# Altium footprint library ref-packages-longpad.PCBLIB: 1527 footprints (part 79 of 103) (continued)
## SQFP-S-28X28-128 [mm] (continued)
  rectangle: -15.9,7.38 -14.45,7.82
  rectangle: -15.9,6.58 -14.45,7.02
  rectangle: -15.9,5.78 -14.45,6.22
  rectangle: -15.9,4.98 -14.45,5.42
  rectangle: -15.9,4.18 -14.45,4.62
  rectangle: -15.9,3.38 -14.45,3.82
  rectangle: -15.9,2.58 -14.45,3.02
  rectangle: -15.9,1.78 -14.45,2.22
  rectangle: -15.9,0.98 -14.45,1.42
  rectangle: -15.9,0.18 -14.45,0.62
  rectangle: -15.9,-0.62 -14.45,-0.18
  rectangle: -15.9,-1.42 -14.45,-0.98
  rectangle: -15.9,-2.22 -14.45,-1.78
  rectangle: -15.9,-3.02 -14.45,-2.58
  rectangle: -15.9,-3.82 -14.45,-3.38
  rectangle: -15.9,-4.62 -14.45,-4.18
  rectangle: -15.9,-5.42 -14.45,-4.98
  rectangle: -15.9,-6.22 -14.45,-5.78
  rectangle: -15.9,-7.02 -14.45,-6.58
  rectangle: -15.9,-7.82 -14.45,-7.38
  rectangle: -15.9,-8.62 -14.45,-8.18
  rectangle: -15.9,-9.42 -14.45,-8.98
  rectangle: -15.9,-10.22 -14.45,-9.78
  rectangle: -15.9,-11.02 -14.45,-10.58
  rectangle: -15.9,-11.82 -14.45,-11.38
  rectangle: -15.9,-12.62 -14.45,-12.18
  lines w0.203: -14.36,-14.36 14.36,-14.36 14.36,14.36 -14.36,14.36 -14.36,-14.36
Mechanical 27:
  lines w0.2: -16.4,-16.4 -16.4,16.4 16.4,16.4 16.4,-16.4 -16.4,-16.4

## SQFP-S-28X28-144 [mm]
pads (144):
  rect 0.4x1.8 smd: 1(-11.375,-15) 2(-10.725,-15) 3(-10.075,-15) 4(-9.425,-15) 5(-8.775,-15) 6(-8.125,-15) 7(-7.475,-15) 8(-6.825,-15) 9(-6.175,-15) 10(-5.525,-15) 11(-4.875,-15) 12(-4.225,-15) 13(-3.575,-15) 14(-2.925,-15) 15(-2.275,-15) 16(-1.625,-15) 17(-0.975,-15) 18(-0.325,-15) 19(0.325,-15) 20(0.975,-15) 21(1.625,-15) 22(2.275,-15) 23(2.925,-15) 24(3.575,-15) 25(4.225,-15) 26(4.875,-15) 27(5.525,-15) 28(6.175,-15) 29(6.825,-15) 30(7.475,-15) 31(8.125,-15) 32(8.775,-15) 33(9.425,-15) 34(10.075,-15) 35(10.725,-15) 36(11.375,-15) 73(11.375,15) 74(10.725,15) 75(10.075,15) 76(9.425,15) 77(8.775,15) 78(8.125,15) 79(7.475,15) 80(6.825,15) 81(6.175,15) 82(5.525,15) 83(4.875,15) 84(4.225,15) 85(3.575,15) 86(2.925,15) 87(2.275,15) 88(1.625,15) 89(0.975,15) 90(0.325,15) 91(-0.325,15) 92(-0.975,15) 93(-1.625,15) 94(-2.275,15) 95(-2.925,15) 96(-3.575,15) 97(-4.225,15) 98(-4.875,15) 99(-5.525,15) 100(-6.175,15) 101(-6.825,15) 102(-7.475,15) 103(-8.125,15) 104(-8.775,15) 105(-9.425,15) 106(-10.075,15) 107(-10.725,15) 108(-11.375,15)
  rect 1.8x0.4 smd: 37(15,-11.375) 38(15,-10.725) 39(15,-10.075) 40(15,-9.425) 41(15,-8.775) 42(15,-8.125) 43(15,-7.475) 44(15,-6.825) 45(15,-6.175) 46(15,-5.525) 47(15,-4.875) 48(15,-4.225) 49(15,-3.575) 50(15,-2.925) 51(15,-2.275) 52(15,-1.625) 53(15,-0.975) 54(15,-0.325) 55(15,0.325) 56(15,0.975) 57(15,1.625) 58(15,2.275) 59(15,2.925) 60(15,3.575) 61(15,4.225) 62(15,4.875) 63(15,5.525) 64(15,6.175) 65(15,6.825) 66(15,7.475) 67(15,8.125) 68(15,8.775) 69(15,9.425) 70(15,10.075) 71(15,10.725) 72(15,11.375) 109(-15,11.375) 110(-15,10.725) 111(-15,10.075) 112(-15,9.425) 113(-15,8.775) 114(-15,8.125) 115(-15,7.475) 116(-15,6.825) 117(-15,6.175) 118(-15,5.525) 119(-15,4.875) 120(-15,4.225) 121(-15,3.575) 122(-15,2.925) 123(-15,2.275) 124(-15,1.625) 125(-15,0.975) 126(-15,0.325) 127(-15,-0.325) 128(-15,-0.975) 129(-15,-1.625) 130(-15,-2.275) 131(-15,-2.925) 132(-15,-3.575) 133(-15,-4.225) 134(-15,-4.875) 135(-15,-5.525) 136(-15,-6.175) 137(-15,-6.825) 138(-15,-7.475) 139(-15,-8.125) 140(-15,-8.775) 141(-15,-9.425) 142(-15,-10.075) 143(-15,-10.725) 144(-15,-11.375)
Top Overlay:
  circle w0.254: c-11.5,-12.75 r0.75
  lines w0.203: -14.17,-14.16 14.16,-14.16 14.16,14.16 -14.17,14.16 -14.17,-14.16
Mechanical 16:
  rectangle: -11.565,-15.9 -11.195,-14.45
  rectangle: -10.915,-15.9 -10.545,-14.45
  rectangle: -10.265,-15.9 -9.895,-14.45
  rectangle: -9.615,-15.9 -9.245,-14.45
  rectangle: -8.965,-15.9 -8.595,-14.45
  rectangle: -8.315,-15.9 -7.945,-14.45
  rectangle: -7.665,-15.9 -7.295,-14.45
  rectangle: -7.015,-15.9 -6.645,-14.45
  rectangle: -6.365,-15.9 -5.995,-14.45
  rectangle: -5.715,-15.9 -5.345,-14.45
  rectangle: -5.065,-15.9 -4.695,-14.45
  rectangle: -4.415,-15.9 -4.045,-14.45
  rectangle: -3.765,-15.9 -3.395,-14.45
  rectangle: -3.115,-15.9 -2.745,-14.45
  rectangle: -2.465,-15.9 -2.095,-14.45
  rectangle: -1.815,-15.9 -1.445,-14.45
  rectangle: -1.165,-15.9 -0.795,-14.45
  rectangle: -0.515,-15.9 -0.145,-14.45
  rectangle: 0.135,-15.9 0.505,-14.45
  rectangle: 0.785,-15.9 1.155,-14.45
  rectangle: 1.435,-15.9 1.805,-14.45
  rectangle: 2.085,-15.9 2.455,-14.45
  rectangle: 2.735,-15.9 3.105,-14.45
  rectangle: 3.385,-15.9 3.755,-14.45
  rectangle: 4.035,-15.9 4.405,-14.45
  rectangle: 4.685,-15.9 5.055,-14.45
  rectangle: 5.335,-15.9 5.705,-14.45
  rectangle: 5.985,-15.9 6.355,-14.45
  rectangle: 6.635,-15.9 7.005,-14.45
  rectangle: 7.285,-15.9 7.655,-14.45
  rectangle: 7.935,-15.9 8.305,-14.45
  rectangle: 8.585,-15.9 8.955,-14.45
  rectangle: 9.235,-15.9 9.605,-14.45
  rectangle: 9.885,-15.9 10.255,-14.45
  rectangle: 10.535,-15.9 10.905,-14.45
  rectangle: 11.185,-15.9 11.555,-14.45
  rectangle: 14.45,-11.565 15.9,-11.195
  rectangle: 14.45,-10.915 15.9,-10.545
  rectangle: 14.45,-10.265 15.9,-9.895
  rectangle: 14.45,-9.615 15.9,-9.245
  rectangle: 14.45,-8.965 15.9,-8.595
  rectangle: 14.45,-8.315 15.9,-7.945
  rectangle: 14.45,-7.665 15.9,-7.295
  rectangle: 14.45,-7.015 15.9,-6.645
  rectangle: 14.45,-6.365 15.9,-5.995
  rectangle: 14.45,-5.715 15.9,-5.345
  rectangle: 14.45,-5.065 15.9,-4.695
  rectangle: 14.45,-4.415 15.9,-4.045
  rectangle: 14.45,-3.765 15.9,-3.395
  rectangle: 14.45,-3.115 15.9,-2.745
  rectangle: 14.45,-2.465 15.9,-2.095
  rectangle: 14.45,-1.815 15.9,-1.445
  rectangle: 14.45,-1.165 15.9,-0.795
  rectangle: 14.45,-0.515 15.9,-0.145
  rectangle: 14.45,0.135 15.9,0.505
  rectangle: 14.45,0.785 15.9,1.155
  rectangle: 14.45,1.435 15.9,1.805
  rectangle: 14.45,2.085 15.9,2.455
  rectangle: 14.45,2.735 15.9,3.105
  rectangle: 14.45,3.385 15.9,3.755
  rectangle: 14.45,4.035 15.9,4.405
  rectangle: 14.45,4.685 15.9,5.055
  rectangle: 14.45,5.335 15.9,5.705
  rectangle: 14.45,5.985 15.9,6.355
  rectangle: 14.45,6.635 15.9,7.005
  rectangle: 14.45,7.285 15.9,7.655
  rectangle: 14.45,7.935 15.9,8.305
  rectangle: 14.45,8.585 15.9,8.955
  rectangle: 14.45,9.235 15.9,9.605
  rectangle: 14.45,9.885 15.9,10.255
  rectangle: 14.45,10.535 15.9,10.905
  rectangle: 14.45,11.185 15.9,11.555
  rectangle: 11.195,14.45 11.565,15.9
  rectangle: 10.545,14.45 10.915,15.9
  rectangle: 9.895,14.45 10.265,15.9
  rectangle: 9.245,14.45 9.615,15.9
  rectangle: 8.595,14.45 8.965,15.9
  rectangle: 7.945,14.45 8.315,15.9
  rectangle: 7.295,14.45 7.665,15.9
  rectangle: 6.645,14.45 7.015,15.9
  rectangle: 5.995,14.45 6.365,15.9
  rectangle: 5.345,14.45 5.715,15.9
  rectangle: 4.695,14.45 5.065,15.9
  rectangle: 4.045,14.45 4.415,15.9
  rectangle: 3.395,14.45 3.765,15.9
  rectangle: 2.745,14.45 3.115,15.9
  rectangle: 2.095,14.45 2.465,15.9
  rectangle: 1.445,14.45 1.815,15.9
  rectangle: 0.795,14.45 1.165,15.9
  rectangle: 0.145,14.45 0.515,15.9
  rectangle: -0.505,14.45 -0.135,15.9
  rectangle: -1.155,14.45 -0.785,15.9
  rectangle: -1.805,14.45 -1.435,15.9
  rectangle: -2.455,14.45 -2.085,15.9
  rectangle: -3.105,14.45 -2.735,15.9
  rectangle: -3.755,14.45 -3.385,15.9
  rectangle: -4.405,14.45 -4.035,15.9
  rectangle: -5.055,14.45 -4.685,15.9
  rectangle: -5.705,14.45 -5.335,15.9
  rectangle: -6.355,14.45 -5.985,15.9
  rectangle: -7.005,14.45 -6.635,15.9
  rectangle: -7.655,14.45 -7.285,15.9
  rectangle: -8.305,14.45 -7.935,15.9
  rectangle: -8.955,14.45 -8.585,15.9
  rectangle: -9.605,14.45 -9.235,15.9
  rectangle: -10.255,14.45 -9.885,15.9
  rectangle: -10.905,14.45 -10.535,15.9
  rectangle: -11.555,14.45 -11.185,15.9
  rectangle: -15.9,11.195 -14.45,11.565
  rectangle: -15.9,10.545 -14.45,10.915
  rectangle: -15.9,9.895 -14.45,10.265
  rectangle: -15.9,9.245 -14.45,9.615
  rectangle: -15.9,8.595 -14.45,8.965
  rectangle: -15.9,7.945 -14.45,8.315
  rectangle: -15.9,7.295 -14.45,7.665
  rectangle: -15.9,6.645 -14.45,7.015
  rectangle: -15.9,5.995 -14.45,6.365
  rectangle: -15.9,5.345 -14.45,5.715
  rectangle: -15.9,4.695 -14.45,5.065
  rectangle: -15.9,4.045 -14.45,4.415
  rectangle: -15.9,3.395 -14.45,3.765
  rectangle: -15.9,2.745 -14.45,3.115
  rectangle: -15.9,2.095 -14.45,2.465
  rectangle: -15.9,1.445 -14.45,1.815
  rectangle: -15.9,0.795 -14.45,1.165
  rectangle: -15.9,0.145 -14.45,0.515
  rectangle: -15.9,-0.505 -14.45,-0.135
  rectangle: -15.9,-1.155 -14.45,-0.785
  rectangle: -15.9,-1.805 -14.45,-1.435
  rectangle: -15.9,-2.455 -14.45,-2.085
  rectangle: -15.9,-3.105 -14.45,-2.735
  rectangle: -15.9,-3.755 -14.45,-3.385
  rectangle: -15.9,-4.405 -14.45,-4.035
  rectangle: -15.9,-5.055 -14.45,-4.685
  rectangle: -15.9,-5.705 -14.45,-5.335
  rectangle: -15.9,-6.355 -14.45,-5.985
  rectangle: -15.9,-7.005 -14.45,-6.635
  rectangle: -15.9,-7.655 -14.45,-7.285
  rectangle: -15.9,-8.305 -14.45,-7.935
  rectangle: -15.9,-8.955 -14.45,-8.585
  rectangle: -15.9,-9.605 -14.45,-9.235
  rectangle: -15.9,-10.255 -14.45,-9.885
  rectangle: -15.9,-10.905 -14.45,-10.535
  rectangle: -15.9,-11.555 -14.45,-11.185
  lines w0.203: -14.36,-14.36 14.36,-14.36 14.36,14.36 -14.36,14.36 -14.36,-14.36
Mechanical 27:
  lines w0.2: -16.4,-16.4 -16.4,16.4 16.4,16.4 16.4,-16.4 -16.4,-16.4

## SQFP-S-28X28-160 [mm]
pads (160):
  rect 0.4x1.8 smd: 1(-12.675,-15) 2(-12.025,-15) 3(-11.375,-15) 4(-10.725,-15) 5(-10.075,-15) 6(-9.425,-15) 7(-8.775,-15) 8(-8.125,-15) 9(-7.475,-15) 10(-6.825,-15) 11(-6.175,-15) 12(-5.525,-15) 13(-4.875,-15) 14(-4.225,-15) 15(-3.575,-15) 16(-2.925,-15) 17(-2.275,-15) 18(-1.625,-15) 19(-0.975,-15) 20(-0.325,-15) 21(0.325,-15) 22(0.975,-15) 23(1.625,-15) 24(2.275,-15) 25(2.925,-15) 26(3.575,-15) 27(4.225,-15) 28(4.875,-15) 29(5.525,-15) 30(6.175,-15) 31(6.825,-15) 32(7.475,-15) 33(8.125,-15) 34(8.775,-15) 35(9.425,-15) 36(10.075,-15) 37(10.725,-15) 38(11.375,-15) 39(12.025,-15) 40(12.675,-15) 81(12.675,15) 82(12.025,15) 83(11.375,15) 84(10.725,15) 85(10.075,15) 86(9.425,15) 87(8.775,15) 88(8.125,15) 89(7.475,15) 90(6.825,15) 91(6.175,15) 92(5.525,15) 93(4.875,15) 94(4.225,15) 95(3.575,15) 96(2.925,15) 97(2.275,15) 98(1.625,15) 99(0.975,15) 100(0.325,15) 101(-0.325,15) 102(-0.975,15) 103(-1.625,15) 104(-2.275,15) 105(-2.925,15) 106(-3.575,15) 107(-4.225,15) 108(-4.875,15) 109(-5.525,15) 110(-6.175,15) 111(-6.825,15) 112(-7.475,15) 113(-8.125,15) 114(-8.775,15) 115(-9.425,15) 116(-10.075,15) 117(-10.725,15) 118(-11.375,15) 119(-12.025,15) 120(-12.675,15)
  rect 1.8x0.4 smd: 41(15,-12.675) 42(15,-12.025) 43(15,-11.375) 44(15,-10.725) 45(15,-10.075) 46(15,-9.425) 47(15,-8.775) 48(15,-8.125) 49(15,-7.475) 50(15,-6.825) 51(15,-6.175) 52(15,-5.525) 53(15,-4.875) 54(15,-4.225) 55(15,-3.575) 56(15,-2.925) 57(15,-2.275) 58(15,-1.625) 59(15,-0.975) 60(15,-0.325) 61(15,0.325) 62(15,0.975) 63(15,1.625) 64(15,2.275) 65(15,2.925) 66(15,3.575) 67(15,4.225) 68(15,4.875) 69(15,5.525) 70(15,6.175) 71(15,6.825) 72(15,7.475) 73(15,8.125) 74(15,8.775) 75(15,9.425) 76(15,10.075) 77(15,10.725) 78(15,11.375) 79(15,12.025) 80(15,12.675) 121(-15,12.675) 122(-15,12.025) 123(-15,11.375) 124(-15,10.725) 125(-15,10.075) 126(-15,9.425) 127(-15,8.775) 128(-15,8.125) 129(-15,7.475) 130(-15,6.825) 131(-15,6.175) 132(-15,5.525) 133(-15,4.875) 134(-15,4.225) 135(-15,3.575) 136(-15,2.925) 137(-15,2.275) 138(-15,1.625) 139(-15,0.975) 140(-15,0.325) 141(-15,-0.325) 142(-15,-0.975) 143(-15,-1.625) 144(-15,-2.275) 145(-15,-2.925) 146(-15,-3.575) 147(-15,-4.225) 148(-15,-4.875) 149(-15,-5.525) 150(-15,-6.175) 151(-15,-6.825) 152(-15,-7.475) 153(-15,-8.125) 154(-15,-8.775) 155(-15,-9.425) 156(-15,-10.075) 157(-15,-10.725) 158(-15,-11.375) 159(-15,-12.025) 160(-15,-12.675)
Top Overlay:
  circle w0.254: c-12.75,-12.75 r0.75
  lines w0.203: -14.17,-14.16 14.16,-14.16 14.16,14.16 -14.17,14.16 -14.17,-14.16
Mechanical 16:
  drawing of 164 lines, arcs and shapes, not listed
Mechanical 27:
  lines w0.2: -16.4,-16.4 -16.4,16.4 16.4,16.4 16.4,-16.4 -16.4,-16.4

## SQFP-S-28X28-208 [mil]
pads (208):
  rect 11.81x62.99 smd: 1(-501.97,-574.8) 2(-482.28,-574.8) 3(-462.6,-574.8) 4(-442.91,-574.8) 5(-423.23,-574.8) 6(-403.54,-574.8) 7(-383.86,-574.8) 8(-364.17,-574.8) 9(-344.49,-574.8) 10(-324.8,-574.8) 11(-305.12,-574.8) 12(-285.43,-574.8) 13(-265.75,-574.8) 14(-246.06,-574.8) 15(-226.38,-574.8) 16(-206.69,-574.8) 17(-187.01,-574.8) 18(-167.32,-574.8) 19(-147.64,-574.8) 20(-127.95,-574.8) 21(-108.27,-574.8) 22(-88.58,-574.8) 23(-68.9,-574.8) 24(-49.21,-574.8) 25(-29.53,-574.8) 26(-9.84,-574.8) 27(9.84,-574.8) 28(29.53,-574.8) 29(49.21,-574.8) 30(68.9,-574.8) 31(88.58,-574.8) 32(108.27,-574.8) 33(127.95,-574.8) 34(147.64,-574.8) 35(167.32,-574.8) 36(187.01,-574.8) 37(206.69,-574.8) 38(226.38,-574.8) 39(246.06,-574.8) 40(265.75,-574.8) 41(285.43,-574.8) 42(305.12,-574.8) 43(324.8,-574.8) 44(344.49,-574.8) 45(364.17,-574.8) 46(383.86,-574.8) 47(403.54,-574.8) 48(423.23,-574.8) 49(442.91,-574.8) 50(462.6,-574.8) 51(482.28,-574.8) 52(501.97,-574.8) 105(501.97,574.8) 106(482.28,574.8) 107(462.6,574.8) 108(442.91,574.8) 109(423.23,574.8) 110(403.54,574.8) 111(383.86,574.8) 112(364.17,574.8) 113(344.49,574.8) 114(324.8,574.8) 115(305.12,574.8) 116(285.43,574.8) 117(265.75,574.8) 118(246.06,574.8) 119(226.38,574.8) 120(206.69,574.8) 121(187.01,574.8) 122(167.32,574.8) 123(147.64,574.8) 124(127.95,574.8) 125(108.27,574.8) 126(88.58,574.8) 127(68.9,574.8) 128(49.21,574.8) 129(29.53,574.8) 130(9.84,574.8) 131(-9.84,574.8) 132(-29.53,574.8) 133(-49.21,574.8) 134(-68.9,574.8) 135(-88.58,574.8) 136(-108.27,574.8) 137(-127.95,574.8) 138(-147.64,574.8) 139(-167.32,574.8) 140(-187.01,574.8) 141(-206.69,574.8) 142(-226.38,574.8) 143(-246.06,574.8) 144(-265.75,574.8) 145(-285.43,574.8) 146(-305.12,574.8) 147(-324.8,574.8) 148(-344.49,574.8) 149(-364.17,574.8) 150(-383.86,574.8) 151(-403.54,574.8) 152(-423.23,574.8) 153(-442.91,574.8) 154(-462.6,574.8) 155(-482.28,574.8) 156(-501.97,574.8)
  rect 62.99x11.81 smd: 53(574.8,-501.97) 54(574.8,-482.28) 55(574.8,-462.6) 56(574.8,-442.91) 57(574.8,-423.23) 58(574.8,-403.54) 59(574.8,-383.86) 60(574.8,-364.17) 61(574.8,-344.49) 62(574.8,-324.8) 63(574.8,-305.12) 64(574.8,-285.43) 65(574.8,-265.75) 66(574.8,-246.06) 67(574.8,-226.38) 68(574.8,-206.69) 69(574.8,-187.01) 70(574.8,-167.32) 71(574.8,-147.64) 72(574.8,-127.95) 73(574.8,-108.27) 74(574.8,-88.58) 75(574.8,-68.9) 76(574.8,-49.21) 77(574.8,-29.53) 78(574.8,-9.84) 79(574.8,9.84) 80(574.8,29.53) 81(574.8,49.21) 82(574.8,68.9) 83(574.8,88.58) 84(574.8,108.27) 85(574.8,127.95) 86(574.8,147.64) 87(574.8,167.32) 88(574.8,187.01) 89(574.8,206.69) 90(574.8,226.38) 91(574.8,246.06) 92(574.8,265.75) 93(574.8,285.43) 94(574.8,305.12) 95(574.8,324.8) 96(574.8,344.49) 97(574.8,364.17) 98(574.8,383.86) 99(574.8,403.54) 100(574.8,423.23) 101(574.8,442.91) 102(574.8,462.6) 103(574.8,482.28) 104(574.8,501.97) 157(-574.8,501.97) 158(-574.8,482.28) 159(-574.8,462.6) 160(-574.8,442.91) 161(-574.8,423.23) 162(-574.8,403.54) 163(-574.8,383.86) 164(-574.8,364.17) 165(-574.8,344.49) 166(-574.8,324.8) 167(-574.8,305.12) 168(-574.8,285.43) 169(-574.8,265.75) 170(-574.8,246.06) 171(-574.8,226.38) 172(-574.8,206.69) 173(-574.8,187.01) 174(-574.8,167.32) 175(-574.8,147.64) 176(-574.8,127.95) 177(-574.8,108.27) 178(-574.8,88.58) 179(-574.8,68.9) 180(-574.8,49.21) 181(-574.8,29.53) 182(-574.8,9.84) 183(-574.8,-9.84) 184(-574.8,-29.53) 185(-574.8,-49.21) 186(-574.8,-68.9) 187(-574.8,-88.58) 188(-574.8,-108.27) 189(-574.8,-127.95) 190(-574.8,-147.64) 191(-574.8,-167.32) 192(-574.8,-187.01) 193(-574.8,-206.69) 194(-574.8,-226.38) 195(-574.8,-246.06) 196(-574.8,-265.75) 197(-574.8,-285.43) 198(-574.8,-305.12) 199(-574.8,-324.8) 200(-574.8,-344.49) 201(-574.8,-364.17) 202(-574.8,-383.86) 203(-574.8,-403.54) 204(-574.8,-423.23) 205(-574.8,-442.91) 206(-574.8,-462.6) 207(-574.8,-482.28) 208(-574.8,-501.97)
Top Overlay:
  circle w10: c-472.44,-472.44 r29.53
  lines w8: -538.19,-537.8 537.8,-537.8 537.8,537.8 -538.19,537.8 -538.19,-537.8
Mechanical 16:
  drawing of 213 lines, arcs and shapes, not listed
Mechanical 27:
  lines w7.87: -625.98,-625.98 -625.98,625.98 625.98,625.98 625.98,-625.98 -625.98,-625.98

## SQFP-S-28X28-216 [mil]
pads (216):
  rect 11.81x62.99 smd: 1(-521.65,-574.8) 2(-501.97,-574.8) 3(-482.28,-574.8) 4(-462.6,-574.8) 5(-442.91,-574.8) 6(-423.23,-574.8) 7(-403.54,-574.8) 8(-383.86,-574.8) 9(-364.17,-574.8) 10(-344.49,-574.8) 11(-324.8,-574.8) 12(-305.12,-574.8) 13(-285.43,-574.8) 14(-265.75,-574.8) 15(-246.06,-574.8) 16(-226.38,-574.8) 17(-206.69,-574.8) 18(-187.01,-574.8) 19(-167.32,-574.8) 20(-147.64,-574.8) 21(-127.95,-574.8) 22(-108.27,-574.8) 23(-88.58,-574.8) 24(-68.9,-574.8) 25(-49.21,-574.8) 26(-29.53,-574.8) 27(-9.84,-574.8) 28(9.84,-574.8) 29(29.53,-574.8) 30(49.21,-574.8) 31(68.9,-574.8) 32(88.58,-574.8) 33(108.27,-574.8) 34(127.95,-574.8) 35(147.64,-574.8) 36(167.32,-574.8) 37(187.01,-574.8) 38(206.69,-574.8) 39(226.38,-574.8) 40(246.06,-574.8) 41(265.75,-574.8) 42(285.43,-574.8) 43(305.12,-574.8) 44(324.8,-574.8) 45(344.49,-574.8) 46(364.17,-574.8) 47(383.86,-574.8) 48(403.54,-574.8) 49(423.23,-574.8) 50(442.91,-574.8) 51(462.6,-574.8) 52(482.28,-574.8) 53(501.97,-574.8) 54(521.65,-574.8) 109(521.65,574.8) 110(501.97,574.8) 111(482.28,574.8) 112(462.6,574.8) 113(442.91,574.8) 114(423.23,574.8) 115(403.54,574.8) 116(383.86,574.8) 117(364.17,574.8) 118(344.49,574.8) 119(324.8,574.8) 120(305.12,574.8) 121(285.43,574.8) 122(265.75,574.8) 123(246.06,574.8) 124(226.38,574.8) 125(206.69,574.8) 126(187.01,574.8) 127(167.32,574.8) 128(147.64,574.8) 129(127.95,574.8) 130(108.27,574.8) 131(88.58,574.8) 132(68.9,574.8) 133(49.21,574.8) 134(29.53,574.8) 135(9.84,574.8) 136(-9.84,574.8) 137(-29.53,574.8) 138(-49.21,574.8) 139(-68.9,574.8) 140(-88.58,574.8) 141(-108.27,574.8) 142(-127.95,574.8) 143(-147.64,574.8) 144(-167.32,574.8) 145(-187.01,574.8) 146(-206.69,574.8) 147(-226.38,574.8) 148(-246.06,574.8) 149(-265.75,574.8) 150(-285.43,574.8) 151(-305.12,574.8) 152(-324.8,574.8) 153(-344.49,574.8) 154(-364.17,574.8) 155(-383.86,574.8) 156(-403.54,574.8) 157(-423.23,574.8) 158(-442.91,574.8) 159(-462.6,574.8) 160(-482.28,574.8) 161(-501.97,574.8) 162(-521.65,574.8)
  rect 62.99x11.81 smd: 55(574.8,-521.65) 56(574.8,-501.97) 57(574.8,-482.28) 58(574.8,-462.6) 59(574.8,-442.91) 60(574.8,-423.23) 61(574.8,-403.54) 62(574.8,-383.86) 63(574.8,-364.17) 64(574.8,-344.49) 65(574.8,-324.8) 66(574.8,-305.12) 67(574.8,-285.43) 68(574.8,-265.75) 69(574.8,-246.06) 70(574.8,-226.38) 71(574.8,-206.69) 72(574.8,-187.01) 73(574.8,-167.32) 74(574.8,-147.64) 75(574.8,-127.95) 76(574.8,-108.27) 77(574.8,-88.58) 78(574.8,-68.9) 79(574.8,-49.21) 80(574.8,-29.53) 81(574.8,-9.84) 82(574.8,9.84) 83(574.8,29.53) 84(574.8,49.21) 85(574.8,68.9) 86(574.8,88.58) 87(574.8,108.27) 88(574.8,127.95) 89(574.8,147.64) 90(574.8,167.32) 91(574.8,187.01) 92(574.8,206.69) 93(574.8,226.38) 94(574.8,246.06) 95(574.8,265.75) 96(574.8,285.43) 97(574.8,305.12) 98(574.8,324.8) 99(574.8,344.49) 100(574.8,364.17) 101(574.8,383.86) 102(574.8,403.54) 103(574.8,423.23) 104(574.8,442.91) 105(574.8,462.6) 106(574.8,482.28) 107(574.8,501.97) 108(574.8,521.65) 163(-574.8,521.65) 164(-574.8,501.97) 165(-574.8,482.28) 166(-574.8,462.6) 167(-574.8,442.91) 168(-574.8,423.23) 169(-574.8,403.54) 170(-574.8,383.86) 171(-574.8,364.17) 172(-574.8,344.49) 173(-574.8,324.8) 174(-574.8,305.12) 175(-574.8,285.43) 176(-574.8,265.75) 177(-574.8,246.06) 178(-574.8,226.38) 179(-574.8,206.69) 180(-574.8,187.01) 181(-574.8,167.32) 182(-574.8,147.64) 183(-574.8,127.95) 184(-574.8,108.27) 185(-574.8,88.58) 186(-574.8,68.9) 187(-574.8,49.21) 188(-574.8,29.53) 189(-574.8,9.84) 190(-574.8,-9.84) 191(-574.8,-29.53) 192(-574.8,-49.21) 193(-574.8,-68.9) 194(-574.8,-88.58) 195(-574.8,-108.27) 196(-574.8,-127.95) 197(-574.8,-147.64) 198(-574.8,-167.32) 199(-574.8,-187.01) 200(-574.8,-206.69) 201(-574.8,-226.38) 202(-574.8,-246.06) 203(-574.8,-265.75) 204(-574.8,-285.43) 205(-574.8,-305.12) 206(-574.8,-324.8) 207(-574.8,-344.49) 208(-574.8,-364.17) 209(-574.8,-383.86) 210(-574.8,-403.54) 211(-574.8,-423.23) 212(-574.8,-442.91) 213(-574.8,-462.6) 214(-574.8,-482.28) 215(-574.8,-501.97) 216(-574.8,-521.65)
Top Overlay:
  circle w10: c-482.28,-482.28 r29.52
  lines w8: -538.19,-537.8 537.8,-537.8 537.8,537.8 -538.19,537.8 -538.19,-537.8
Mechanical 16:
  drawing of 221 lines, arcs and shapes, not listed
Mechanical 27:
  lines w7.87: -625.98,-625.98 -625.98,625.98 625.98,625.98 625.98,-625.98 -625.98,-625.98

## SQFP-S-28X28-264 [mm]
pads (264):
  rect 0.25x1.6 smd: 1(-13,-14.6) 2(-12.6,-14.6) 3(-12.2,-14.6) 4(-11.8,-14.6) 5(-11.4,-14.6) 6(-11,-14.6) 7(-10.6,-14.6) 8(-10.2,-14.6) 9(-9.8,-14.6) 10(-9.4,-14.6) 11(-9,-14.6) 12(-8.6,-14.6) 13(-8.2,-14.6) 14(-7.8,-14.6) 15(-7.4,-14.6) 16(-7,-14.6) 17(-6.6,-14.6) 18(-6.2,-14.6) 19(-5.8,-14.6) 20(-5.4,-14.6) 21(-5,-14.6) 22(-4.6,-14.6) 23(-4.2,-14.6) 24(-3.8,-14.6) 25(-3.4,-14.6) 26(-3,-14.6) 27(-2.6,-14.6) 28(-2.2,-14.6) 29(-1.8,-14.6) 30(-1.4,-14.6) 31(-1,-14.6) 32(-0.6,-14.6) 33(-0.2,-14.6) 34(0.2,-14.6) 35(0.6,-14.6) 36(1,-14.6) 37(1.4,-14.6) 38(1.8,-14.6) 39(2.2,-14.6) 40(2.6,-14.6) 41(3,-14.6) 42(3.4,-14.6) 43(3.8,-14.6) 44(4.2,-14.6) 45(4.6,-14.6) 46(5,-14.6) 47(5.4,-14.6) 48(5.8,-14.6) 49(6.2,-14.6) 50(6.6,-14.6) 51(7,-14.6) 52(7.4,-14.6) 53(7.8,-14.6) 54(8.2,-14.6) 55(8.6,-14.6) 56(9,-14.6) 57(9.4,-14.6) 58(9.8,-14.6) 59(10.2,-14.6) 60(10.6,-14.6) 61(11,-14.6) 62(11.4,-14.6) 63(11.8,-14.6) 64(12.2,-14.6) 65(12.6,-14.6) 66(13,-14.6) 133(13,14.6) 134(12.6,14.6) 135(12.2,14.6) 136(11.8,14.6) 137(11.4,14.6) 138(11,14.6) 139(10.6,14.6) 140(10.2,14.6) 141(9.8,14.6) 142(9.4,14.6) 143(9,14.6) 144(8.6,14.6) 145(8.2,14.6) 146(7.8,14.6) 147(7.4,14.6) 148(7,14.6) 149(6.6,14.6) 150(6.2,14.6) 151(5.8,14.6) 152(5.4,14.6) 153(5,14.6) 154(4.6,14.6) 155(4.2,14.6) 156(3.8,14.6) 157(3.4,14.6) 158(3,14.6) 159(2.6,14.6) 160(2.2,14.6) 161(1.8,14.6) 162(1.4,14.6) 163(1,14.6) 164(0.6,14.6) 165(0.2,14.6) 166(-0.2,14.6) 167(-0.6,14.6) 168(-1,14.6) 169(-1.4,14.6) 170(-1.8,14.6) 171(-2.2,14.6) 172(-2.6,14.6) 173(-3,14.6) 174(-3.4,14.6) 175(-3.8,14.6) 176(-4.2,14.6) 177(-4.6,14.6) 178(-5,14.6) 179(-5.4,14.6) 180(-5.8,14.6) 181(-6.2,14.6) 182(-6.6,14.6) 183(-7,14.6) 184(-7.4,14.6) 185(-7.8,14.6) 186(-8.2,14.6) 187(-8.6,14.6) 188(-9,14.6) 189(-9.4,14.6) 190(-9.8,14.6) 191(-10.2,14.6) 192(-10.6,14.6) 193(-11,14.6) 194(-11.4,14.6) 195(-11.8,14.6) 196(-12.2,14.6) 197(-12.6,14.6) 198(-13,14.6)
  rect 1.6x0.25 smd: 67(14.6,-13) 68(14.6,-12.6) 69(14.6,-12.2) 70(14.6,-11.8) 71(14.6,-11.4) 72(14.6,-11) 73(14.6,-10.6) 74(14.6,-10.2) 75(14.6,-9.8) 76(14.6,-9.4) 77(14.6,-9) 78(14.6,-8.6) 79(14.6,-8.2) 80(14.6,-7.8) 81(14.6,-7.4) 82(14.6,-7) 83(14.6,-6.6) 84(14.6,-6.2) 85(14.6,-5.8) 86(14.6,-5.4) 87(14.6,-5) 88(14.6,-4.6) 89(14.6,-4.2) 90(14.6,-3.8) 91(14.6,-3.4) 92(14.6,-3) 93(14.6,-2.6) 94(14.6,-2.2) 95(14.6,-1.8) 96(14.6,-1.4) 97(14.6,-1) 98(14.6,-0.6) 99(14.6,-0.2) 100(14.6,0.2) 101(14.6,0.6) 102(14.6,1) 103(14.6,1.4) 104(14.6,1.8) 105(14.6,2.2) 106(14.6,2.6) 107(14.6,3) 108(14.6,3.4) 109(14.6,3.8) 110(14.6,4.2) 111(14.6,4.6) 112(14.6,5) 113(14.6,5.4) 114(14.6,5.8) 115(14.6,6.2) 116(14.6,6.6) 117(14.6,7) 118(14.6,7.4) 119(14.6,7.8) 120(14.6,8.2) 121(14.6,8.6) 122(14.6,9) 123(14.6,9.4) 124(14.6,9.8) 125(14.6,10.2) 126(14.6,10.6) 127(14.6,11) 128(14.6,11.4) 129(14.6,11.8) 130(14.6,12.2) 131(14.6,12.6) 132(14.6,13) 199(-14.6,13) 200(-14.6,12.6) 201(-14.6,12.2) 202(-14.6,11.8) 203(-14.6,11.4) 204(-14.6,11) 205(-14.6,10.6) 206(-14.6,10.2) 207(-14.6,9.8) 208(-14.6,9.4) 209(-14.6,9) 210(-14.6,8.6) 211(-14.6,8.2) 212(-14.6,7.8) 213(-14.6,7.4) 214(-14.6,7) 215(-14.6,6.6) 216(-14.6,6.2) 217(-14.6,5.8) 218(-14.6,5.4) 219(-14.6,5) 220(-14.6,4.6) 221(-14.6,4.2) 222(-14.6,3.8) 223(-14.6,3.4) 224(-14.6,3) 225(-14.6,2.6) 226(-14.6,2.2) 227(-14.6,1.8) 228(-14.6,1.4) 229(-14.6,1) 230(-14.6,0.6) 231(-14.6,0.2) 232(-14.6,-0.2) 233(-14.6,-0.6) 234(-14.6,-1) 235(-14.6,-1.4) 236(-14.6,-1.8) 237(-14.6,-2.2) 238(-14.6,-2.6) 239(-14.6,-3) 240(-14.6,-3.4) 241(-14.6,-3.8) 242(-14.6,-4.2) 243(-14.6,-4.6) 244(-14.6,-5) 245(-14.6,-5.4) 246(-14.6,-5.8) 247(-14.6,-6.2) 248(-14.6,-6.6) 249(-14.6,-7) 250(-14.6,-7.4) 251(-14.6,-7.8) 252(-14.6,-8.2) 253(-14.6,-8.6) 254(-14.6,-9) 255(-14.6,-9.4) 256(-14.6,-9.8) 257(-14.6,-10.2) 258(-14.6,-10.6) 259(-14.6,-11) 260(-14.6,-11.4) 261(-14.6,-11.8) 262(-14.6,-12.2) 263(-14.6,-12.6) 264(-14.6,-13)
Top Overlay:
  circle w0.254: c-12.25,-12.25 r0.75
  lines w0.203: -13.67,-13.66 13.66,-13.66 13.66,13.66 -13.67,13.66 -13.67,-13.66
Mechanical 16:
  drawing of 269 lines, arcs and shapes, not listed
Mechanical 27:
  lines w0.2: -15.9,-15.9 -15.9,15.9 15.9,15.9 15.9,-15.9 -15.9,-15.9